# Altium footprint library Wurth_Elektronik_Electromechanic_Wire_to_Board_Connectors_rev16a.PCBLIB: 662 footprints (part 23 of 42)
Each footprint in its own frame and in the unit in brackets; x right, y up, seen from the top. Pads: shape width x height; smd on the part's side, far side on the other; paste and mask are expansions set on the pad; w line width, h text height; cw(c..) or ccw(c..) is an arc to the next point about the centre after c.
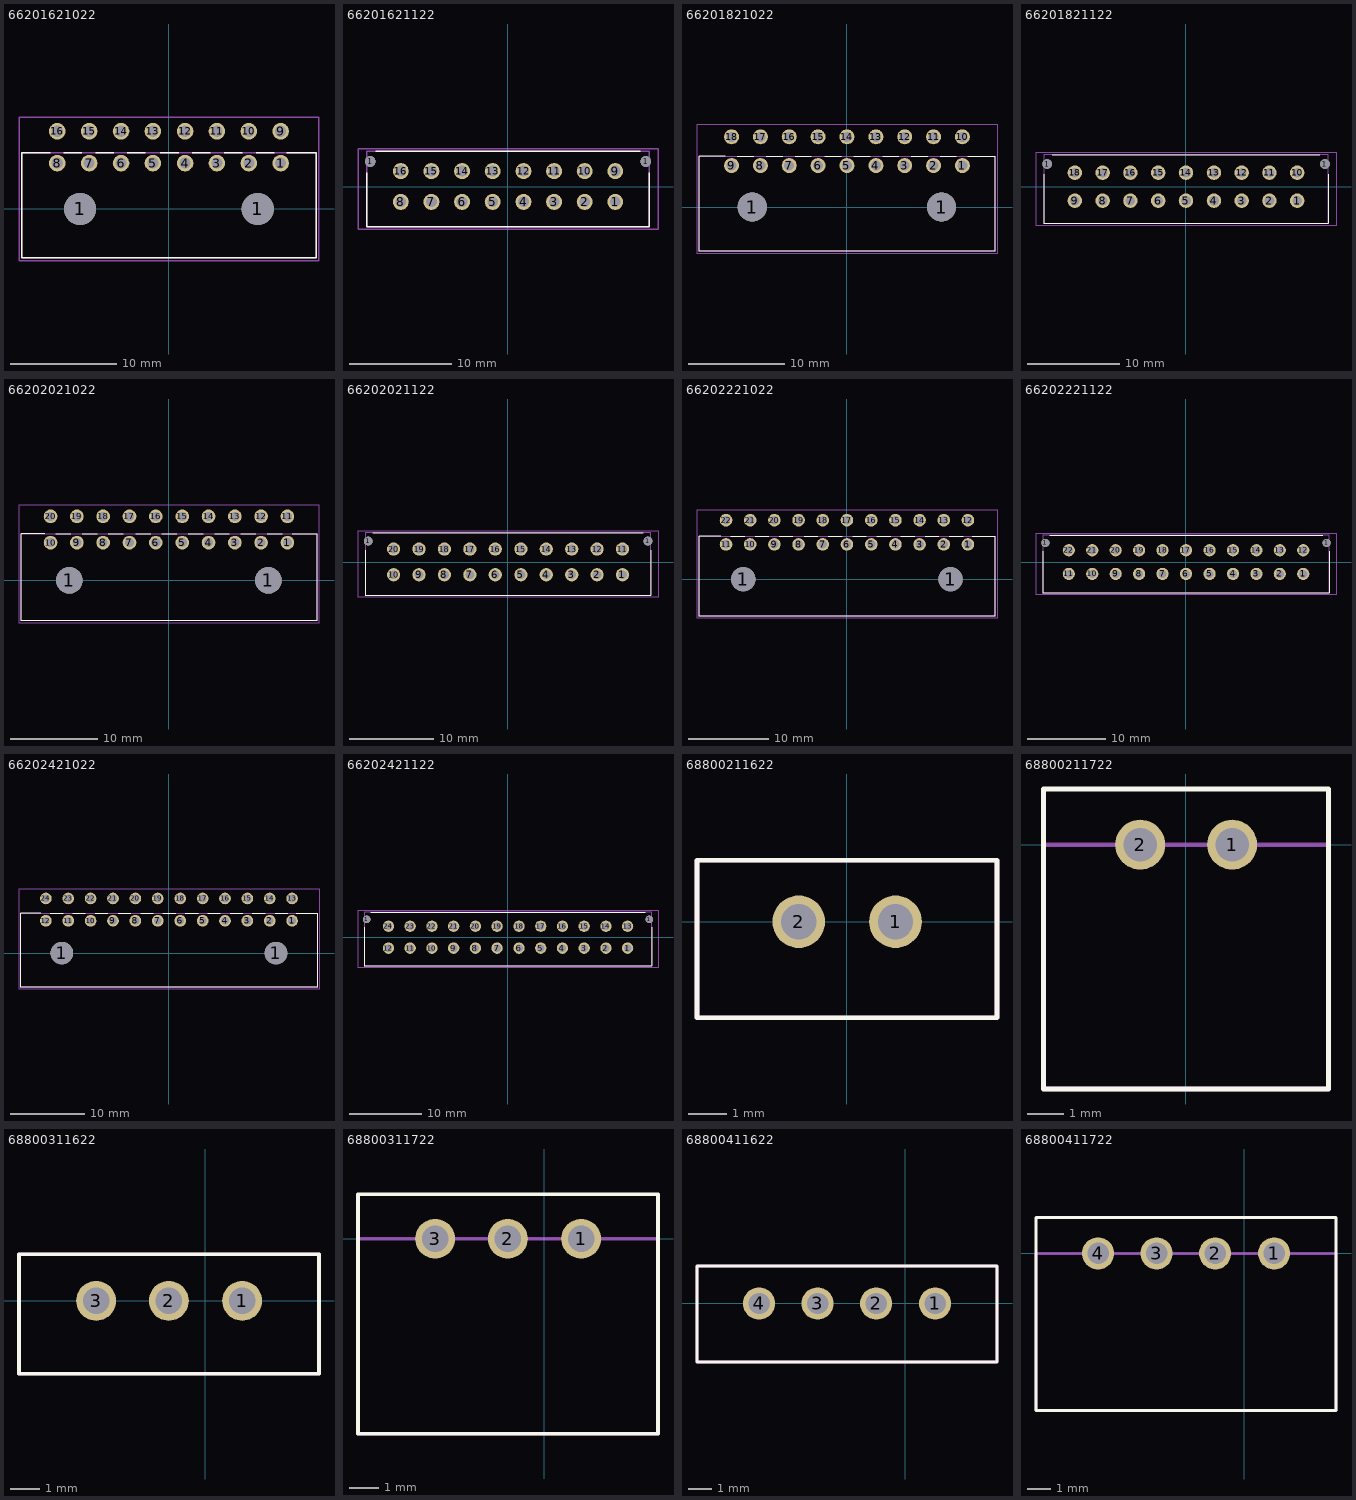
[diagram p22: the footprints below, top view; thin cyan lines are the x and y axes]

## 66201621022 [mil]
pads (18):
  round 119 hole 119: 1(-328.74,0) 1(329,0)
  round 61.5 hole 41: 1(414,170) 2(296,170) 3(178,170) 4(60,170) 5(-59.06,170) 6(-177.17,170) 7(-295.28,170) 8(-413.39,170) 9(414,288) 10(296,288) 11(178,288) 12(60,288) 13(-59.06,288) 14(-177.17,288) 15(-295.28,288) 16(-413.39,288)
Top Overlay:
  lines w5: -439.37,209 -545.28,209 -545.28,-181.1 546,-181.1 546,209 436,209 ; -389.76,209 -322.83,209 ; -271.65,209 -204.72,209 ; -153.54,209 -86.61,209 ; -31.5,209 36,209 ; 87,209 154,209 ; 205,209 272,209 ; 323,209 390,209
Mechanical 2:
  text ">NAME" at 614,104 h77.5
Mechanical 4:
  text ">VALUE" at 614,29 h77.5
Mechanical 16:
  lines w5: -545.28,-181.1 546,-181.1 546,209 -545.28,209 -545.28,-181.1
  text "1" at 389,154 h77.5
  text "16" at -454.72,254 h77.5
Mechanical 27:
  lines w5: -555.12,-190.94 556,-190.94 556,339 -555.12,339 -555.12,-190.94

## 66201621122 [mil]
pads (18):
  round 41 hole 41: 1(-531.5,97) 1(532,97)
  round 61.5 hole 41: 1(414,-59.06) 2(296,-59.06) 3(178,-59.06) 4(60,-59.06) 5(-59.06,-59.06) 6(-177.17,-59.06) 7(-295.28,-59.06) 8(-413.39,-59.06) 9(414,60) 10(296,60) 11(178,60) 12(60,60) 13(-59.06,60) 14(-177.17,60) 15(-295.28,60) 16(-413.39,60)
Top Overlay:
  lines w5: -545.28,54 -545.28,-154.72 546,-154.72 546,54 ; -509.84,136 510,136
Mechanical 2:
  text ">NAME" at -956.3,0 h77.5
Mechanical 4:
  text ">VALUE" at -987.01,-91.14 h77.5
Mechanical 16:
  lines w5: -545.28,-154.72 -545.28,136 546,136 546,-154.72 -545.28,-154.72
  text "1" at 389,-75 h77.5
  text "16" at -436.61,25 h77.5
Mechanical 27:
  lines w5: -578.74,-164.57 579,-164.57 579,146 -578.74,146 -578.74,-164.57

## 66201821022 [mil]
pads (20):
  round 119 hole 119: 1(-387.8,0) 1(388,0)
  round 61.5 hole 41: 1(473,170) 2(355,170) 3(237,170) 4(119,170) 5(0,170) 6(-118.11,170) 7(-236.22,170) 8(-354.33,170) 9(-472.44,170) 10(473,288) 11(355,288) 12(237,288) 13(119,288) 14(0,288) 15(-118.11,288) 16(-236.22,288) 17(-354.33,288) 18(-472.44,288)
Top Overlay:
  lines w5: -498.43,209 -604.33,209 -604.33,-181.1 605,-181.1 605,209 495,209 ; -448.82,209 -381.89,209 ; -330.71,209 -263.78,209 ; -212.6,209 -145.67,209 ; -90.55,209 -23.62,209 ; 28,209 95,209 ; 146,209 213,209 ; 264,209 331,209 ; 382,209 449,209
Mechanical 2:
  text ">NAME" at 673,104 h77.5
Mechanical 4:
  text ">VALUE" at 673,29 h77.5
Mechanical 16:
  lines w5: -604.33,-181.1 605,-181.1 605,209 -604.33,209 -604.33,-181.1
  text "1" at 448,154 h77.5
  text "18" at -513.78,254 h77.5
Mechanical 27:
  lines w5: -614.17,-190.94 615,-190.94 615,339 -614.17,339 -614.17,-190.94

## 66201821122 [mil]
pads (20):
  round 41 hole 41: 1(-590.55,97) 1(591,97)
  round 61.5 hole 41: 1(473,-59.06) 2(355,-59.06) 3(237,-59.06) 4(119,-59.06) 5(0,-59.06) 6(-118.11,-59.06) 7(-236.22,-59.06) 8(-354.33,-59.06) 9(-472.44,-59.06) 10(473,60) 11(355,60) 12(237,60) 13(119,60) 14(0,60) 15(-118.11,60) 16(-236.22,60) 17(-354.33,60) 18(-472.44,60)
Top Overlay:
  lines w5: -604.33,54 -604.33,-154.72 605,-154.72 605,54 ; -568.9,136 569,136
Mechanical 2:
  text ">NAME" at -997.24,0 h77.5
Mechanical 4:
  text ">VALUE" at -1027.95,-91.14 h77.5
Mechanical 16:
  lines w5: -604.33,-154.72 -604.33,136 605,136 605,-154.72 -604.33,-154.72
  text "1" at 448,-75 h77.5
  text "18" at -477.56,25 h77.5
Mechanical 27:
  lines w5: -637.8,-164.57 638,-164.57 638,146 -637.8,146 -637.8,-164.57

## 66202021022 [mil]
pads (22):
  round 119 hole 119: 1(-446.85,0) 1(447,0)
  round 61.5 hole 41: 1(532,170) 2(414,170) 3(296,170) 4(178,170) 5(60,170) 6(-59.06,170) 7(-177.17,170) 8(-295.28,170) 9(-413.39,170) 10(-531.5,170) 11(532,288) 12(414,288) 13(296,288) 14(178,288) 15(60,288) 16(-59.06,288) 17(-177.17,288) 18(-295.28,288) 19(-413.39,288) 20(-531.5,288)
Top Overlay:
  lines w5: -557.48,209 -663.39,209 -663.39,-181.1 664,-181.1 664,209 554,209 ; -507.87,209 -440.94,209 ; -389.76,209 -322.83,209 ; -271.65,209 -204.72,209 ; -149.61,209 -82.68,209 ; -31.5,209 36,209 ; 87,209 154,209 ; 205,209 272,209 ; 323,209 390,209 ; 441,209 508,209
Mechanical 2:
  text ">NAME" at 732,104 h77.5
Mechanical 4:
  text ">VALUE" at 732,29 h77.5
Mechanical 16:
  lines w5: -663.39,-181.1 664,-181.1 664,209 -663.39,209 -663.39,-181.1
  text "1" at 507,154 h77.5
  text "20" at -554.72,254 h77.5
Mechanical 27:
  lines w5: -673.23,-190.94 674,-190.94 674,339 -673.23,339 -673.23,-190.94

## 66202021122 [mil]
pads (22):
  round 41 hole 41: 1(-649.61,97) 1(650,97)
  round 61.5 hole 41: 1(532,-59.06) 2(414,-59.06) 3(296,-59.06) 4(178,-59.06) 5(60,-59.06) 6(-59.06,-59.06) 7(-177.17,-59.06) 8(-295.28,-59.06) 9(-413.39,-59.06) 10(-531.5,-59.06) 11(532,60) 12(414,60) 13(296,60) 14(178,60) 15(60,60) 16(-59.06,60) 17(-177.17,60) 18(-295.28,60) 19(-413.39,60) 20(-531.5,60)
Top Overlay:
  lines w5: -663.39,54 -663.39,-154.72 664,-154.72 664,54 ; -627.95,136 628,136
Mechanical 2:
  text ">NAME" at -1063.19,0 h77.5
Mechanical 4:
  text ">VALUE" at -1093.9,-66.14 h77.5
Mechanical 16:
  lines w5: -663.39,-154.72 -663.39,136 664,136 664,-154.72 -663.39,-154.72
  text "1" at 507,-75 h77.5
  text "20" at -543.5,25 h77.5
Mechanical 27:
  lines w5: -696.85,-164.57 697,-164.57 697,146 -696.85,146 -696.85,-164.57

## 66202221022 [mil]
pads (24):
  round 119 hole 119: 1(-505.91,0) 1(506,0)
  round 61.5 hole 41: 1(591,170) 2(473,170) 3(355,170) 4(237,170) 5(119,170) 6(0,170) 7(-118.11,170) 8(-236.22,170) 9(-354.33,170) 10(-472.44,170) 11(-590.55,170) 12(591,288) 13(473,288) 14(355,288) 15(237,288) 16(119,288) 17(0,288) 18(-118.11,288) 19(-236.22,288) 20(-354.33,288) 21(-472.44,288) 22(-590.55,288)
Top Overlay:
  lines w5: -616.54,209 -722.44,209 -722.44,-181.1 723,-181.1 723,209 613,209 ; -566.93,209 -500,209 ; -448.82,209 -381.89,209 ; -330.71,209 -263.78,209 ; -208.66,209 -141.73,209 ; -90.55,209 -23.62,209 ; 28,209 95,209 ; 146,209 213,209 ; 264,209 331,209 ; 382,209 449,209 ; 500,209 567,209
Mechanical 2:
  text ">NAME" at 791,104 h77.5
Mechanical 4:
  text ">VALUE" at 791,29 h77.5
Mechanical 16:
  lines w5: -722.44,-181.1 723,-181.1 723,209 -722.44,209 -722.44,-181.1
  text "1" at 566,154 h77.5
  text "22" at -620.67,254 h77.5
Mechanical 27:
  lines w5: -732.28,-190.94 733,-190.94 733,339 -732.28,339 -732.28,-190.94

## 66202221122 [mil]
pads (24):
  round 41 hole 41: 1(-708.66,97) 1(709,97)
  round 61.5 hole 41: 1(591,-59.06) 2(473,-59.06) 3(355,-59.06) 4(237,-59.06) 5(119,-59.06) 6(0,-59.06) 7(-118.11,-59.06) 8(-236.22,-59.06) 9(-354.33,-59.06) 10(-472.44,-59.06) 11(-590.55,-59.06) 12(591,60) 13(473,60) 14(355,60) 15(237,60) 16(119,60) 17(0,60) 18(-118.11,60) 19(-236.22,60) 20(-354.33,60) 21(-472.44,60) 22(-590.55,60)
Top Overlay:
  lines w5: -722.44,54 -722.44,-154.72 723,-154.72 723,54 ; -687.01,136 688,136
Mechanical 2:
  text ">NAME" at -1045.08,0 h77.5
Mechanical 4:
  text ">VALUE" at -1075.79,-66.14 h77.5
Mechanical 16:
  lines w5: -722.44,-154.72 -722.44,136 723,136 723,-154.72 -722.44,-154.72
  text "1" at 566,-75 h77.5
  text "22" at -584.45,25 h77.5
Mechanical 27:
  lines w5: -755.91,-164.57 756,-164.57 756,146 -755.91,146 -755.91,-164.57

## 66202421022 [mil]
pads (26):
  round 119 hole 119: 1(-564.96,0) 1(565,0)
  round 61.5 hole 41: 1(650,170) 2(532,170) 3(414,170) 4(296,170) 5(178,170) 6(60,170) 7(-59.06,170) 8(-177.17,170) 9(-295.28,170) 10(-413.39,170) 11(-531.5,170) 12(-649.61,170) 13(650,288) 14(532,288) 15(414,288) 16(296,288) 17(178,288) 18(60,288) 19(-59.06,288) 20(-177.17,288) 21(-295.28,288) 22(-413.39,288) 23(-531.5,288) 24(-649.61,288)
Top Overlay:
  lines w5: -675.59,209 -781.5,209 -781.5,-181.1 782,-181.1 782,209 672,209 ; -625.98,209 -559.06,209 ; -507.87,209 -440.94,209 ; -389.76,209 -322.83,209 ; -267.72,209 -200.79,209 ; -149.61,209 -82.68,209 ; -31.5,209 36,209 ; 87,209 154,209 ; 205,209 272,209 ; 323,209 390,209 ; 441,209 508,209 ; 560,209 626,209
Mechanical 2:
  text ">NAME" at 850,104 h77.5
Mechanical 4:
  text ">VALUE" at 850,29 h77.5
Mechanical 16:
  lines w5: -781.5,-181.1 782,-181.1 782,209 -781.5,209 -781.5,-181.1
  text "1" at 625,154 h77.5
  text "24" at -679.72,254 h77.5
Mechanical 27:
  lines w5: -791.34,-190.94 792,-190.94 792,339 -791.34,339 -791.34,-190.94

## 66202421122 [mil]
pads (26):
  round 41 hole 41: 1(-767.72,97) 1(768,97)
  round 61.5 hole 41: 1(650,-59.06) 2(532,-59.06) 3(414,-59.06) 4(296,-59.06) 5(178,-59.06) 6(60,-59.06) 7(-59.06,-59.06) 8(-177.17,-59.06) 9(-295.28,-59.06) 10(-413.39,-59.06) 11(-531.5,-59.06) 12(-649.61,-59.06) 13(650,60) 14(532,60) 15(414,60) 16(296,60) 17(178,60) 18(60,60) 19(-59.06,60) 20(-177.17,60) 21(-295.28,60) 22(-413.39,60) 23(-531.5,60) 24(-649.61,60)
Top Overlay:
  lines w5: -781.5,54 -781.5,-154.72 782,-154.72 782,54 ; -746.06,136 747,136
Mechanical 2:
  text ">NAME" at -1111.02,0 h77.5
Mechanical 4:
  text ">VALUE" at -1141.73,-66.14 h77.5
Mechanical 16:
  lines w5: -781.5,-154.72 -781.5,136 782,136 782,-154.72 -781.5,-154.72
  text "1" at 625,-75 h77.5
  text "24" at -650.39,25 h77.5
Mechanical 27:
  lines w5: -814.96,-164.57 815,-164.57 815,146 -814.96,146 -814.96,-164.57

## 68800211622 [mil]
pads (2):
  round 54 hole 36: 1(50,0) 2(-49.21,0)
Top Overlay:
  lines w5: -153.54,-98.43 154,-98.43 154,63 -153.54,63 -153.54,-98.43
Mechanical 2:
  text ">NAME" at 176,0 h77.5
Mechanical 4:
  text ">VALUE" at 185,-77.95 h77.5
Mechanical 16:
  lines w5: -153.54,-98.43 154,-98.43 154,63 -153.54,63 -153.54,-98.43
  text "1" at 25,-24.61 h77.5
  text "2" at -73.82,-24.61 h77.5

## 68800211722 [mil]
pads (2):
  round 54 hole 36: 1(50,0) 2(-49.21,0)
Top Overlay:
  lines w5: -153.54,-263.78 154,-263.78 154,60 -153.54,60 -153.54,-263.78
Mechanical 2:
  text ">NAME" at 176,0 h77.5
Mechanical 4:
  text ">VALUE" at 185,-77.95 h77.5
Mechanical 16:
  lines w5: -153.54,-263.78 154,-263.78 154,0 -153.54,0 -153.54,-263.78
  text "1" at 25,-24.61 h77.5
  text "2" at -73.82,-24.61 h77.5

## 68800311622 [mil]
pads (3):
  round 54 hole 36: 1(50,0) 2(-49.21,0) 3(-147.64,0)
Top Overlay:
  lines w5: -251.97,-98.43 154,-98.43 154,63 -251.97,63 -251.97,-98.43
Mechanical 2:
  text ">NAME" at 176,0 h77.5
Mechanical 4:
  text ">VALUE" at 185,-77.95 h77.5
Mechanical 16:
  lines w5: -251.97,-98.43 154,-98.43 154,63 -251.97,63 -251.97,-98.43
  text "1" at 25,-24.61 h77.5
  text "3" at -172.24,-24.61 h77.5

## 68800311722 [mil]
pads (3):
  round 54 hole 36: 1(50,0) 2(-49.21,0) 3(-147.64,0)
Top Overlay:
  lines w5: -251.97,-263.78 154,-263.78 154,60 -251.97,60 -251.97,-263.78
Mechanical 2:
  text ">NAME" at 176,0 h77.5
Mechanical 4:
  text ">VALUE" at 185,-77.95 h77.5
Mechanical 16:
  lines w5: -251.97,-263.78 154,-263.78 154,0 -251.97,0 -251.97,-263.78
  text "1" at 25,-24.61 h77.5
  text "3" at -172.24,-24.61 h77.5

## 68800411622 [mil]
pads (4):
  round 54 hole 36: 1(50,0) 2(-49.21,0) 3(-147.64,0) 4(-246.06,0)
Top Overlay:
  lines w5: -350.39,-98.43 154,-98.43 154,63 -350.39,63 -350.39,-98.43
Mechanical 2:
  text ">NAME" at 176,0 h77.5
Mechanical 4:
  text ">VALUE" at 185,-77.95 h77.5
Mechanical 16:
  lines w5: -350.39,-98.43 154,-98.43 154,63 -350.39,63 -350.39,-98.43
  text "1" at 25,-24.61 h77.5
  text "4" at -270.67,-24.61 h77.5

## 68800411722 [mil]
pads (4):
  round 54 hole 36: 1(50,0) 2(-49.21,0) 3(-147.64,0) 4(-246.06,0)
Top Overlay:
  lines w5: -350.39,-263.78 154,-263.78 154,60 -350.39,60 -350.39,-263.78
Mechanical 2:
  text ">NAME" at 176,0 h77.5
Mechanical 4:
  text ">VALUE" at 185,-77.95 h77.5
Mechanical 16:
  lines w5: -350.39,-263.78 154,-263.78 154,0 -350.39,0 -350.39,-263.78
  text "1" at 25,-24.61 h77.5
  text "4" at -270.67,-24.61 h77.5